# Altium footprint library hallglib.PcbLib: 89 footprints (part 3 of 6)
Each footprint in its own frame and in the unit in brackets; x right, y up, seen from the top. Pads: shape width x height; smd on the part's side, far side on the other; paste and mask are expansions set on the pad; w line width, h text height; cw(c..) or ccw(c..) is an arc to the next point about the centre after c.
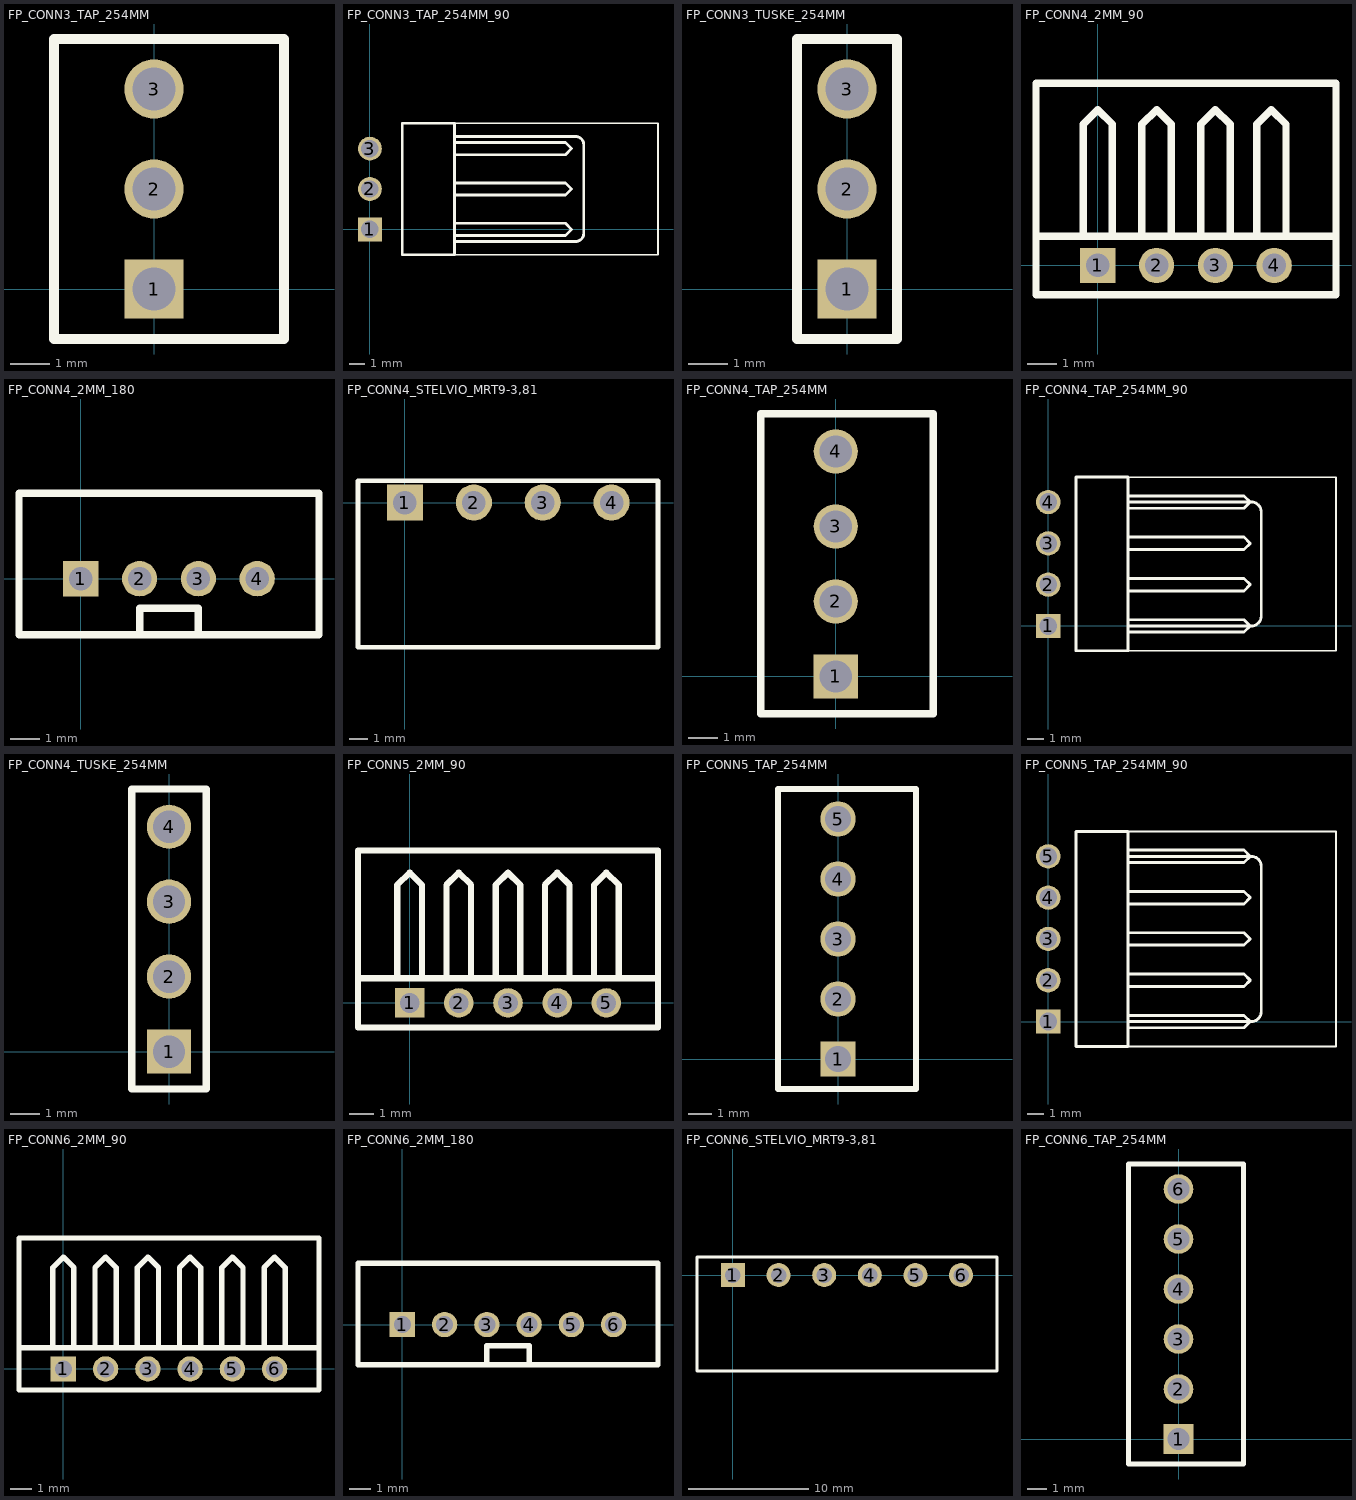
[diagram p2: the footprints below, top view; thin cyan lines are the x and y axes]

## FP_CONN3_TAP_254MM [mm] "álló három pólusú tápcsatlakozó 2.54mm"
height 11.4
pads (3):
  rect 1.5x1.5 hole 1.1: 1(0,0)
  round 1.5 hole 1.1: 2(0,2.54) 3(0,5.08)
Top Overlay:
  lines w0.254: -2.54,-1.27 3.302,-1.27 3.302,6.35 -2.54,6.35 -2.54,-1.27
3D body "Cvilux_CI31_3.step": height 11.56, standoff -3.24, extent -2.521,-1.27 3.279,6.35

## FP_CONN3_TAP_254MM_90 [mm] "fekvő három pólusú tápcsatlakozó 2.54mm"
height 11.4
pads (3):
  rect 1.5x1.5 hole 1.1: 1(0,0)
  round 1.5 hole 1.1: 2(0,2.54) 3(0,5.08)
Top Overlay:
  lines w0.102: 5.334,-1.6 18.136,-1.6 18.136,6.68 5.334,6.68
  lines w0.178: 5.334,-1.6 2.032,-1.6 2.032,6.68 5.334,6.68 5.334,-1.524 ; 5.334,-0.762 12.954,-0.762 ccw(c12.954,-0.254) 13.462,-0.254 13.462,5.334 ccw(c12.954,5.334) 12.954,5.842 5.334,5.842 ; 5.334,-0.381 12.319,-0.381 12.7,0 12.319,0.381 5.334,0.381 ; 5.334,2.159 12.319,2.159 12.7,2.54 12.319,2.921 5.334,2.921 ; 5.334,4.699 12.319,4.699 12.7,5.08 12.319,5.461 5.334,5.461
3D body "254_TAP_3P.STEP": height 5.8, standoff -3.4, extent -0.325,-1.3 13.5,6.32

## FP_CONN3_TUSKE_254MM [mm] "3×1 tüskesor"
height 8.54
pads (3):
  rect 1.5x1.5 hole 1.1: 1(0,0)
  round 1.5 hole 1.1: 2(0,2.54) 3(0,5.08)
Top Overlay:
  lines w0.254: -1.27,-1.27 -1.27,6.35 1.27,6.35 1.27,-1.27 -1.27,-1.27
3D body: height 2.54, standoff 0, extent -1.27,-1.27 1.27,3.81
3D body: height 0, standoff -3, extent -0.33,-0.33 0.33,0.33
3D body: height 0, standoff -3, extent -0.33,2.21 0.33,2.87
3D body: height 8.54, standoff 2.54, extent -0.33,2.21 0.33,2.87
3D body: height 8.54, standoff 2.54, extent -0.33,-0.33 0.33,0.33
3D body: height 8.54, standoff 2.54, extent -0.33,4.75 0.33,5.41
3D body: height 0, standoff -3, extent -0.33,4.75 0.33,5.41
3D body: height 2.54, standoff 0, extent -1.27,3.81 1.27,6.35

## FP_CONN4_2MM_90 [mm] "fekvő 4 pólusú csatlakozó 2mm"
height 5
pads (4):
  rect 1.2x1.2 hole 0.8: 1(0,0)
  round 1.2 hole 0.8: 2(2,0) 3(4,0) 4(6,0)
Top Overlay:
  lines w0.254: -2.1,1 8.1,1 ; -0.5,1 -0.5,4.8 0,5.3 0.5,4.8 0.5,1 ; 1.5,1 1.5,4.8 2,5.3 2.5,4.8 2.5,1 ; 3.5,1 3.5,4.8 4,5.3 4.5,4.8 4.5,1 ; 5.4,1 5.4,4.8 5.9,5.3 6.4,4.8 6.4,1 ; -2.1,-1 8.1,-1 8.1,6.2 -2.1,6.2 -2.1,-1
3D body: height 5, standoff 0, extent -2,0.2 8,6.1

## FP_CONN4_2MM_180 [mm] "álló 4 pólusú csatlakozó 2mm"
height 6.1
pads (4):
  rect 1.2x1.2 hole 0.8: 1(0,0)
  round 1.2 hole 0.8: 2(2,0) 3(4,0) 4(6,0)
Top Overlay:
  lines w0.254: 2,-1.9 2,-1 4,-1 4,-1.9 ; -2.1,-1.9 8.1,-1.9 8.1,2.9 -2.1,2.9 -2.1,-1.9
3D body: height 5, standoff 0, extent -2,-1.8 8,2.8

## FP_CONN4_STELVIO_MRT9-3,81 [mm] "STELVIO gyártmányú sorkapocs csatlakozó MRT9 fekvő"
height 7.25
pads (4):
  rect 2x2 hole 1.3: 1(0,0)
  round 2 hole 1.3: 2(3.81,0) 3(7.62,0) 4(11.43,0)
Top Overlay:
  lines w0.254: -2.6,-8 14,-8 14,1.2 -2.6,1.2 -2.6,-8
3D body: height 7.25, standoff 0, extent -2.5,-8 -1.5,-1.2
3D body: height 7.25, standoff 0, extent -2.5,-1.2 14,1.2
3D body: height 7.25, standoff 0, extent 13,-8 14,-1.2
3D body: height 7.25, standoff 0, extent 1.65,-8 2.15,-1.2
3D body: height 7.25, standoff 0, extent 5.462,-8 5.962,-1.2
3D body: height 7.25, standoff 0, extent 9.275,-8 9.775,-1.2
3D body: height 1, standoff 0, extent -1.5,-8 13,-1.2
3D body: height 7.25, standoff 6.75, extent -1.5,-8 13,-1.2
3D body: height 0, standoff -3, extent -0.4,-0.4 0.4,0.4
3D body: height 0, standoff -3, extent 3.41,-0.4 4.21,0.4
3D body: height 0, standoff -3, extent 7.22,-0.4 8.02,0.4
3D body: height 0, standoff -3, extent 11.03,-0.4 11.83,0.4

## FP_CONN4_TAP_254MM [mm] "álló két pólusú tápcsatlakozó 2.54mm"
height 6.3
pads (4):
  rect 1.5x1.5 hole 1.1: 1(0,0)
  round 1.5 hole 1.1: 2(0,2.54) 3(0,5.08) 4(0,7.62)
Top Overlay:
  lines w0.254: -2.54,-1.27 -2.54,8.89 3.302,8.89 3.302,-1.27 -2.54,-1.27
3D body "Cvilux_CI31_4.step": height 11.56, standoff -3.24, extent -2.521,-1.27 3.279,8.89

## FP_CONN4_TAP_254MM_90 [mm] "fekvő két pólusú tápcsatlakozó 2.54mm"
height 6.3
pads (4):
  rect 1.5x1.5 hole 1.1: 1(0,0)
  round 1.5 hole 1.1: 2(0,2.54) 3(0,5.08) 4(0,7.62)
Top Overlay:
  lines w0.102: 4.9,-1.53 17.7,-1.53 17.7,9.15 4.9,9.15
  lines w0.178: 4.9,0 12.5,0 ccw(c12.5,0.6) 13.1,0.6 13.1,7.02 ccw(c12.5,7.02) 12.5,7.62 4.9,7.62 ; 4.934,-0.381 12.046,-0.381 12.427,0 12.046,0.381 4.934,0.381 ; 4.934,2.159 12.046,2.159 12.427,2.54 12.046,2.921 4.934,2.921 ; 4.934,4.699 12.046,4.699 12.427,5.08 12.046,5.461 4.934,5.461 ; 4.934,7.239 12.046,7.239 12.427,7.62 12.046,8.001 4.934,8.001 ; 1.7,-1.524 4.9,-1.524 4.9,9.15 1.7,9.15 1.7,-1.524
3D body "254_TAP_4P.STEP": height 5.8, standoff -3.4, extent -0.343,-1.295 13.482,8.865

## FP_CONN4_TUSKE_254MM [mm] "4×1 tüskesor"
height 8.54
pads (4):
  rect 1.5x1.5 hole 1.1: 1(0,0)
  round 1.5 hole 1.1: 2(0,2.54) 3(0,5.08) 4(0,7.62)
Top Overlay:
  lines w0.254: -1.27,-1.27 1.27,-1.27 1.27,8.9 -1.27,8.9 -1.27,-1.27
3D body: height 2.54, standoff 0, extent -1.27,3.81 1.27,8.89
3D body: height 0, standoff -3, extent -0.33,4.75 0.33,5.41
3D body: height 0, standoff -3, extent -0.33,7.29 0.33,7.95
3D body: height 8.54, standoff 2.54, extent -0.33,7.29 0.33,7.95
3D body: height 8.54, standoff 2.54, extent -0.33,4.75 0.33,5.41
3D body: height 8.54, standoff 2.54, extent -0.33,-0.33 0.33,0.33
3D body: height 8.54, standoff 2.54, extent -0.33,2.21 0.33,2.87
3D body: height 0, standoff -3, extent -0.33,2.21 0.33,2.87
3D body: height 0, standoff -3, extent -0.33,-0.33 0.33,0.33
3D body: height 2.54, standoff 0, extent -1.27,-1.27 1.27,3.81

## FP_CONN5_2MM_90 [mm] "fekvő 5 pólusú csatlakozó 2mm"
height 5
pads (5):
  rect 1.2x1.2 hole 0.8: 1(0,0)
  round 1.2 hole 0.8: 2(2,0) 3(4,0) 4(6,0) 5(8,0)
Top Overlay:
  lines w0.254: -2.1,1 10.1,1 ; -0.5,1 -0.5,4.8 0,5.3 0.5,4.8 0.5,1 ; 1.5,1 1.5,4.8 2,5.3 2.5,4.8 2.5,1 ; 3.5,1 3.5,4.8 4,5.3 4.5,4.8 4.5,1 ; 5.5,1 5.5,4.8 6,5.3 6.5,4.8 6.5,1 ; 7.5,1 7.5,4.8 8,5.3 8.5,4.8 8.5,1 ; -2.1,-1 -2.1,6.2 10.1,6.2 10.1,-1 -2.1,-1
3D body: height 5, standoff 0, extent -2,0.2 10,6.1

## FP_CONN5_TAP_254MM [mm] "álló öt pólusú tápcsatlakozó 2.54mm"
height 6.3
pads (5):
  rect 1.5x1.5 hole 1.1: 1(0,0)
  round 1.5 hole 1.1: 2(0,2.54) 3(0,5.08) 4(0,7.62) 5(0,10.16)
Top Overlay:
  lines w0.254: -2.54,-1.27 -2.54,11.43 3.302,11.43 3.302,-1.27 -2.54,-1.27
3D body "Cvilux_CI31_5.step": height 11.56, standoff -3.24, extent -2.54,-1.27 3.26,11.43

## FP_CONN5_TAP_254MM_90 [mm] "fekvő öt pólusú tápcsatlakozó 2.54mm"
height 6.3
pads (5):
  rect 1.5x1.5 hole 1.1: 1(0,0)
  round 1.5 hole 1.1: 2(0,2.54) 3(0,5.08) 4(0,7.62) 5(0,10.16)
Top Overlay:
  lines w0.102: 4.9,-1.53 17.7,-1.53 17.7,11.684 4.9,11.684
  lines w0.178: 4.9,0 12.5,0 ccw(c12.5,0.6) 13.1,0.6 13.1,9.525 ; 4.9,10.16 12.5,10.16 cw(c12.5,9.56) 13.1,9.56 ; 4.934,-0.381 12.046,-0.381 12.427,0 12.046,0.381 4.934,0.381 ; 4.934,2.159 12.046,2.159 12.427,2.54 12.046,2.921 4.934,2.921 ; 4.934,4.699 12.046,4.699 12.427,5.08 12.046,5.461 4.934,5.461 ; 4.934,7.239 12.046,7.239 12.427,7.62 12.046,8.001 4.934,8.001 ; 4.934,9.779 12.046,9.779 12.427,10.16 12.046,10.541 4.934,10.541 ; 1.7,-1.524 4.9,-1.524 4.9,11.684 1.7,11.684 1.7,-1.524
3D body "254_TAP_4P.STEP": height 5.8, standoff -3.4, extent -0.343,1.245 13.482,11.405
3D body "254_TAP_4P.STEP": height 5.8, standoff -3.4, extent -0.343,-1.295 13.482,8.865

## FP_CONN6_2MM_90 [mm] "fekvő 6 pólusú csatlakozó 2mm"
height 5
pads (6):
  rect 1.2x1.2 hole 0.8: 1(0,0)
  round 1.2 hole 0.8: 2(2,0) 3(4,0) 4(6,0) 5(8,0) 6(10,0)
Top Overlay:
  lines w0.254: -2.1,1 12.1,1 ; -0.5,1 -0.5,4.8 0,5.3 0.5,4.8 0.5,1 ; 1.5,1 1.5,4.8 2,5.3 2.5,4.8 2.5,1 ; 3.5,1 3.5,4.8 4,5.3 4.5,4.8 4.5,1 ; 5.5,1 5.5,4.8 6,5.3 6.5,4.8 6.5,1 ; 7.5,1 7.5,4.8 8,5.3 8.5,4.8 8.5,1 ; 9.5,1 9.5,4.8 10,5.3 10.5,4.8 10.5,1 ; -2.1,-1 -2.1,6.2 12.1,6.2 12.1,-1 -2.1,-1
3D body: height 5, standoff 0, extent -2,0.2 12,6.1

## FP_CONN6_2MM_180 [mm] "álló 6 pólusú csatlakozó 2mm"
height 6.1
pads (6):
  rect 1.2x1.2 hole 0.8: 1(0,0)
  round 1.2 hole 0.8: 2(2,0) 3(4,0) 4(6,0) 5(8,0) 6(10,0)
Top Overlay:
  lines w0.254: 4,-1.9 4,-1 6,-1 6,-1.9 ; -2.1,-1.9 12.1,-1.9 12.1,2.9 -2.1,2.9 -2.1,-1.9
3D body: height 5, standoff 0, extent -2,-1.8 12,2.8

## FP_CONN6_STELVIO_MRT9-3,81 [mm] "STELVIO gyártmányú sorkapocs csatlakozó MRT9 fekvő"
height 7.25
pads (6):
  rect 2x2 hole 1.3: 1(0,0)
  round 2 hole 1.3: 2(3.81,0) 3(7.62,0) 4(11.43,0) 5(15.24,0) 6(19.05,0)
Top Overlay:
  lines w0.254: -3,-8 22.05,-8 22.05,1.5 -3,1.5 -3,-8
3D body: height 7.25, standoff 0, extent -2.5,-8 -1.5,-1.2
3D body: height 7.25, standoff 0, extent -2.5,-1.2 21.5,1.2
3D body: height 7.25, standoff 0, extent 20.5,-8 21.5,-1.2
3D body: height 7.25, standoff 0, extent 1.65,-8 2.15,-1.2
3D body: height 7.25, standoff 0, extent 5.462,-8 5.962,-1.2
3D body: height 7.25, standoff 0, extent 9.275,-8 9.775,-1.2
3D body: height 7.25, standoff 0, extent 13.087,-8 13.587,-1.2
3D body: height 7.25, standoff 0, extent 16.9,-8 17.4,-1.2
3D body: height 1, standoff 0, extent -1.5,-8 20.5,-1.2
3D body: height 7.25, standoff 6.75, extent -1.5,-8 20.5,-1.2
3D body: height 0, standoff -3, extent -0.4,-0.4 0.4,0.4
3D body: height 0, standoff -3, extent 3.41,-0.4 4.21,0.4
3D body: height 0, standoff -3, extent 7.22,-0.4 8.02,0.4
3D body: height 0, standoff -3, extent 11.03,-0.4 11.83,0.4
3D body: height 0, standoff -3, extent 14.84,-0.4 15.64,0.4
3D body: height 0, standoff -3, extent 18.65,-0.4 19.45,0.4

## FP_CONN6_TAP_254MM [mm] "álló hat pólusú tápcsatlakozó 2.54mm"
height 6.3
pads (6):
  rect 1.5x1.5 hole 1.1: 1(0,0)
  round 1.5 hole 1.1: 2(0,2.54) 3(0,5.08) 4(0,7.62) 5(0,10.16) 6(0,12.7)
Top Overlay:
  lines w0.254: -2.54,-1.27 -2.54,13.97 3.302,13.97 3.302,-1.27 -2.54,-1.27
3D body "Cvilux_CI31_6.step": height 11.56, standoff -3.24, extent -2.521,-1.27 3.279,13.97